# Altium footprint library mastermind.PCBLIB: 1061 footprints (part 53 of 67)
Each footprint in its own frame and in the unit in brackets; x right, y up, seen from the top. Pads: shape width x height; smd on the part's side, far side on the other; paste and mask are expansions set on the pad; w line width, h text height; cw(c..) or ccw(c..) is an arc to the next point about the centre after c.
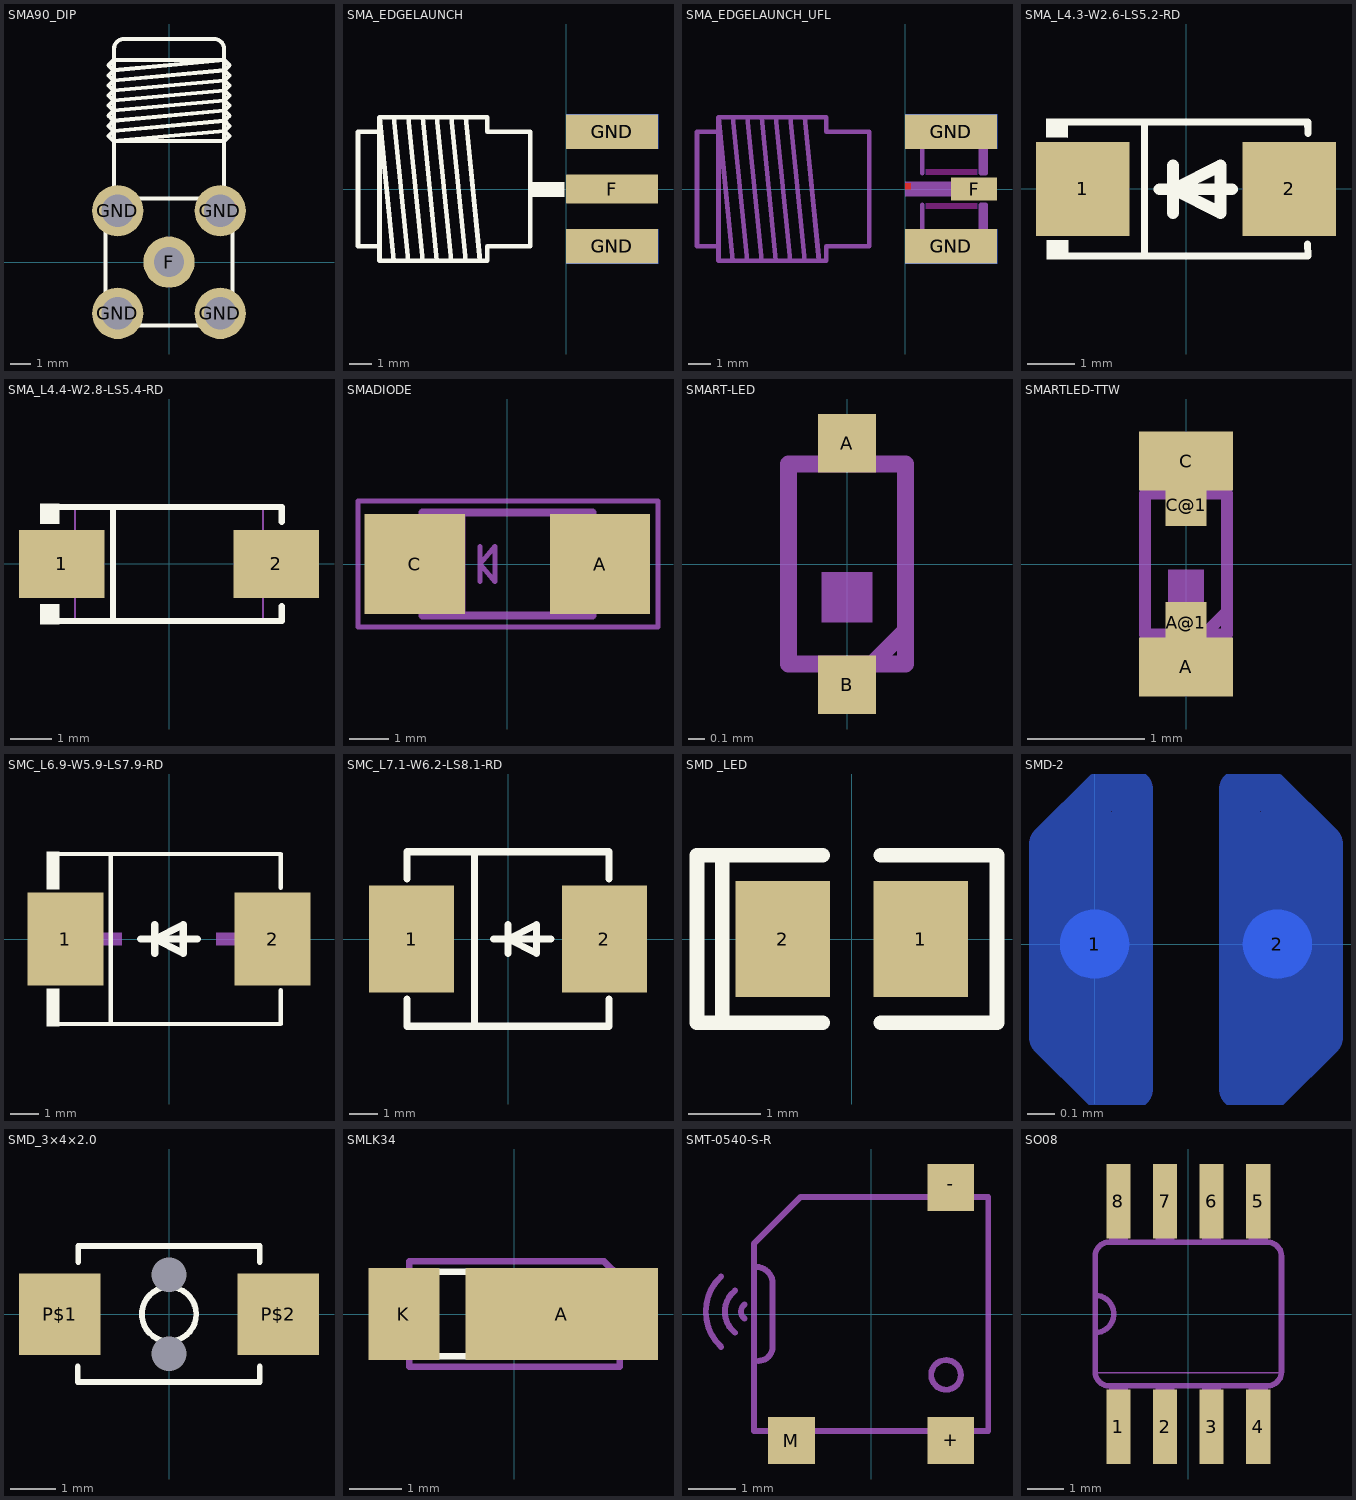
[diagram p52: the footprints below, top view; thin cyan lines are the x and y axes]

## SMA90_DIP [mm]
pads (5):
  round 2.54 hole 1.5: F(0,0)
  round 2.54 hole 1.6: GND(-2.54,-2.54) GND(-2.54,2.54) GND(2.54,-2.54) GND(2.54,2.54)
Top Overlay:
  lines w0.203: -2.725,3.15 -2.725,10.55 ; -2.72,10.565 cw(c-2.235,10.565) -2.235,11.05 ; -2.225,11.05 2.225,11.05 ; 2.24,11.05 cw(c2.24,10.565) 2.725,10.565 ; 2.725,3.15 2.725,10.55 ; -2.75,6 2.75,6.5 ; -2.75,6 2.75,6 3,6.25 2.75,6.5 ; -2.75,6 -3,6.25 -2.75,6.5 ; -2.75,6.5 2.75,7 ; -2.75,6.5 -3,6.75 -2.75,7 ; -2.75,7 2.75,7.5 ; -2.75,7 -3,7.25 -2.75,7.5 ; -2.75,7.5 2.75,8 ; -2.75,7.5 -3,7.75 -2.75,8 ; -2.75,8 2.75,8.5 ; -2.75,8 -3,8.25 -2.75,8.5 ; -2.75,8.5 2.75,9 ; -2.75,8.5 -3,8.75 -2.75,9 ; -2.75,9 2.75,9.5 ; -2.75,9 -3,9.25 -2.75,9.5 ; -2.75,9.5 2.75,10 ; -2.75,9.5 -3,9.75 -2.75,10 2.75,10 ; 2.75,6.5 3,6.75 2.75,7 ; 2.75,7 3,7.25 2.75,7.5 ; 2.75,7.5 3,7.75 2.75,8 ; 2.75,8 3,8.25 2.75,8.5 ; 2.75,8.5 3,8.75 2.75,9 ; 2.75,9 3,9.25 2.75,9.5 ; 2.75,9.5 3,9.75 2.75,10 ; -3.15,-2.52 ccw(c-2.52,-2.52) -2.52,-3.15 2.52,-3.15 ccw(c2.52,-2.52) 3.15,-2.52 3.15,2.52 ccw(c2.52,2.52) 2.52,3.15 -2.52,3.15 ccw(c-2.52,2.52) -3.15,2.52 -3.15,-2.52

## SMA_EDGELAUNCH [mil]
pads (5):
  rect 160x50 smd paste-80: F(80,0)
  rect 160x60 smd paste-80: GND(80,-100) GND(80,100)
  rect 160x60 smd far side paste-80: GND(80,-100) GND(80,100)
Top Overlay:
  region: -60,-13.5 -60,11.5 -3.5,11.5 -3.5,-13.5
  lines w8: -150,-125 -175,125 ; -325,-100 -325,100 ; -325,-100 -325,-125 -300,-125 ; -325,-100 -362.5,-100 -362.5,100 -325,100 ; -325,100 -325,125 ; -325,125 -300,-125 ; -325,125 -300,125 ; -300,-125 -275,-125 ; -300,125 -275,-125 ; -300,125 -275,125 ; -275,-125 -250,-125 ; -275,125 -250,-125 ; -275,125 -250,125 ; -250,-125 -225,-125 ; -250,125 -225,-125 ; -250,125 -225,125 ; -225,-125 -200,-125 ; -225,125 -200,-125 ; -225,125 -200,125 ; -200,-125 -175,-125 ; -200,125 -175,-125 ; -200,125 -175,125 ; -175,-125 -137.5,-125 -137.5,-100 -62.5,-100 -62.5,100 -137.5,100 -137.5,125 -175,125

## SMA_EDGELAUNCH_UFL [mil]
pads (5):
  rect 80x40 smd paste-40: F(120,0)
  rect 160x60 smd paste-80: GND(80,-100) GND(80,100)
  rect 160x60 smd far side paste-80: GND(80,-100) GND(80,100)
Top Layer:
  region: 0,0 10,0 10,10 0,10
  region: 0,0 10,0 10,10 0,10
Top Layer keep-out:
  region: 36,25 36,34 126,34 126,25
  region: 36,-34 36,-25 126,-25 126,-34
Top Paste:
  region: 123,-38.94 123,-70.94 39,-70.94 39,-38.94
  region: 39,38.94 39,70.94 123,70.94 123,38.94
  region: 126,-19 126,19 156,19 156,-19
Top Solder:
  region: 127,-36.94 127,-72.94 35,-72.94 35,-36.94
  region: 35,36.94 35,72.94 127,72.94 127,36.94
Mechanical 8:
  region: 0,0 10,0 10,10 0,10
  region: 0,0 10,0 10,10 0,10
  region: 0,-12.5 0,12.5 125,12.5 125,-12.5
  lines w8: -150,-125 -175,125 ; 29.82,-27.56 29.82,-82.68 132.18,-82.68 ; 29.82,27.56 29.82,82.68 132.18,82.68 ; 136.12,-78.74 136.12,-27.56 ; 136.12,27.56 136.12,78.74 ; -325,-100 -325,100 ; -325,-100 -362.5,-100 -362.5,100 -325,100 ; -325,-100 -325,-125 -300,-125 ; -325,100 -325,125 ; -325,125 -300,-125 ; -325,125 -300,125 ; -300,-125 -275,-125 ; -300,125 -275,-125 ; -300,125 -275,125 ; -275,-125 -250,-125 ; -275,125 -250,-125 ; -275,125 -250,125 ; -250,-125 -225,-125 ; -250,125 -225,-125 ; -250,125 -225,125 ; -225,-125 -200,-125 ; -225,125 -200,-125 ; -225,125 -200,125 ; -200,-125 -175,-125 ; -200,125 -175,-125 ; -200,125 -175,125 ; -175,-125 -137.5,-125 -137.5,-100 -62.5,-100 -62.5,100 -137.5,100 -137.5,125 -175,125 ; 132.18,-82.68 140.06,-82.68 140.06,-27.56 132.18,-27.56 132.18,-82.68 ; 132.18,82.68 140.06,82.68 140.06,27.56 132.18,27.56 132.18,82.68

## SMA_L4.3-W2.6-LS5.2-RD [mm]
pads (2):
  rect 2x2 smd paste+0 mask+0.051: 1(-2.2,0) 2(2.2,0)
Top Overlay:
  region: -2.52,1.502 -2.521,1.096 -2.981,1.1 -2.977,1.502
  region: -2.512,-1.096 -2.513,-1.503 -2.973,-1.498 -2.969,-1.096
  lines w0.152: -2.596,-1.426 2.596,-1.426 ; -2.596,1.426 2.596,1.426 2.603,1.187 ; -0.884,-1.426 -0.884,1.426 ; 2.593,-1.176 2.6,-1.415
  lines w0.254: -0.565,-0.005 0.984,-0.005 ; -0.276,0.503 -0.276,-0.513 -0.276,-0.005 ; -0.276,-0.005 0.74,-0.513 0.74,0.503 -0.276,-0.005
Mechanical 15:
  region: -2.317,-0.101 -2.317,0.101 -1.507,0.101 -1.507,-0.101
  region: 2.29,-0.09 2.29,0.112 1.48,0.112 1.48,-0.09
  region: 2.014,-0.675 2.014,0.675 1.811,0.675 1.811,-0.675

## SMA_L4.4-W2.8-LS5.4-RD [mm]
pads (2):
  rect 2.046x1.62 smd paste+0 mask+0.051: 1(-2.565,0) 2(2.565,0)
Top Overlay:
  region: -2.625,-1.44 -2.625,-0.962 -3.082,-0.962 -3.082,-1.44
  region: -2.625,1.44 -2.625,0.962 -3.082,0.962 -3.082,1.44
  lines w0.152: -2.701,-1.364 2.701,-1.364 2.701,-1.013 ; -2.701,1.364 2.701,1.364 2.701,1.013 ; -1.339,-1.364 -1.339,1.364
Mechanical 6:
  region: 2.142,-0.644 2.142,0.644 1.949,0.644 1.949,-0.644
  region: 2.432,-0.097 2.432,0.097 1.659,0.097 1.659,-0.097
  region: -2.432,-0.097 -2.432,0.097 -1.659,0.097 -1.659,-0.097
Mechanical 15:
  region: 2.809,0.725 2.809,-0.725 1.659,-0.725 1.659,0.725
  region: -2.8,-0.725 -2.8,0.725 -1.65,0.725 -1.65,-0.725
  region: -2.74,-1.375 -2.74,-1.35 -2.775,-1.315 -2.825,-1.315 -2.86,-1.35 -2.86,-1.375 -2.86,-1.4 -2.825,-1.435 -2.775,-1.435 -2.74,-1.4
  lines w0.051: -2.25,-1.375 2.25,-1.375 2.25,1.375 -2.25,1.375 -2.25,-1.375

## SMADIODE [mil]
pads (2):
  rect 100x100 smd: A(92.5,0) C(-92.5,0)
Mechanical 2:
  lines w5: -149.17,-54.88 -149.17,-45.12 ; -27.5,-17.5 -27.5,17.5 ; 150.24,52.62 150.24,54.88 ; -149.17,-45.12 -149.17,-62.99 150.24,-62.99 150.24,54.88 ; -149.17,-45.12 -149.17,62.99 150.24,62.99 150.24,54.88 ; -27.5,0 -12.5,-17.5 -12.5,17.5 -27.5,0
Mechanical 8:
  region: -68.9,-48.23 -68.9,48.23 -42.32,48.23 -42.32,-48.23
  region: 111.22,43.31 111.22,-43.31 85.63,-43.31 85.63,43.31
  region: -111.22,-43.31 -111.22,43.31 -85.63,43.31 -85.63,-43.31
  lines w8: -84.65,-51.18 -84.65,51.18 84.65,51.18 84.65,-51.18 -84.65,-51.18

## SMART-LED [mm]
pads (2):
  rect 0.35x0.35 smd: A(0,0.725) B(0,-0.725)
Mechanical 2:
  region: -0.15,-0.35 -0.15,-0.05 0.15,-0.05 0.15,-0.35
  lines w0.102: -0.35,-0.6 -0.35,0.6 ; 0.35,-0.6 0.35,0.6
Mechanical 8:
  region: -0.15,0.6 -0.15,0.85 0.15,0.85 0.15,0.6
  region: -0.15,-0.85 -0.15,-0.6 0.15,-0.6 0.15,-0.85
  lines w0.102: -0.35,-0.6 0.35,-0.6 ; -0.35,0.6 0.35,0.6 ; 0.15,-0.6 0.35,-0.4

## SMARTLED-TTW [mm]
pads (4):
  rect 0.8x0.5 smd paste-0.4 mask-0.4: A(0,-0.875) C(0,0.875)
  rect 0.35x0.35 smd paste-0.175 mask-0.175: A@1(0,-0.5) C@1(0,0.5)
Top Paste:
  region: 0.225,-0.3 0.225,-0.975 -0.225,-0.975 -0.225,-0.3
  region: -0.225,0.3 -0.225,0.975 0.225,0.975 0.225,0.3
Top Solder:
  region: 0.175,-0.325 0.175,-0.7 -0.175,-0.7 -0.175,-0.325
  region: -0.175,0.325 -0.175,0.7 0.175,0.7 0.175,0.325
Mechanical 2:
  region: -0.15,-0.35 -0.15,-0.05 0.15,-0.05 0.15,-0.35
  lines w0.102: -0.35,-0.6 -0.35,0.6 ; 0.35,-0.6 0.35,0.6
Mechanical 8:
  region: -0.15,-0.85 -0.15,-0.6 0.15,-0.6 0.15,-0.85
  region: -0.15,0.6 -0.15,0.85 0.15,0.85 0.15,0.6
  lines w0.102: -0.35,-0.6 0.35,-0.6 ; -0.35,0.6 0.35,0.6 ; 0.15,-0.6 0.35,-0.4

## SMC_L6.9-W5.9-LS7.9-RD [mm]
pads (2):
  rect 2.7x3.3 smd paste+0 mask+0.051: 1(-3.686,0) 2(3.686,0)
Top Overlay:
  region: -3.9,3.102 -3.9,1.772 -4.357,1.772 -4.357,3.102
  region: -3.9,-3.102 -3.9,-1.772 -4.357,-1.772 -4.357,-3.102
  lines w0.152: -3.976,-3.026 3.976,-3.026 3.976,-1.823 ; -3.976,3.026 3.976,3.026 3.976,1.823 ; -2.069,-3.026 -2.069,3.026
  lines w0.254: -1.016,0 1.016,0 ; -0.508,0.508 -0.508,-0.508 -0.508,0 ; -0.508,0 0.508,-0.508 0.508,0.508 -0.508,0
Mechanical 15:
  region: -3.457,-0.221 -3.457,0.221 -1.687,0.221 -1.687,-0.221
  region: 3.457,-0.221 3.457,0.221 1.687,0.221 1.687,-0.221
  region: 2.794,-1.475 2.794,1.475 2.351,1.475 2.351,-1.475

## SMC_L7.1-W6.2-LS8.1-RD [mm]
pads (2):
  rect 3.03x3.82 smd paste+0 mask+0.051: 1(-3.435,0) 2(3.435,0)
Top Overlay:
  lines w0.254: -3.6,-2.141 -3.6,-3.11 3.6,-3.11 3.6,-2.141 ; -3.6,2.141 -3.6,3.11 3.6,3.11 3.6,2.141 ; -1.192,-3.11 -1.192,3.11 ; -0.508,0 1.524,0 ; 0,0.508 0,-0.508 0,0 ; 0,0 1.016,0.508 1.016,-0.508 0,0
Mechanical 15:
  region: 2.54,0.254 4.318,0.254 4.318,-0.254 2.54,-0.254
  region: 3.181,-0.895 3.181,0.883 3.689,0.883 3.689,-0.895
  region: -4.33,0.254 -2.552,0.254 -2.552,-0.254 -4.33,-0.254
3D body "DO-214AB.STEP": height 2.79, standoff -0.14, extent -4.05,-3.125 4,3.125

## SMD _LED [mm]
pads (2):
  rect 1.3x1.6 smd: 1(0.948,0.006) 2(-0.952,0.006)
Top Overlay:
  lines w0.2: -1.782,-1.144 -1.782,1.156 ; -0.402,-1.144 -2.132,-1.144 -2.132,1.156 -0.402,1.156 ; 0.398,-1.144 1.998,-1.144 1.998,1.156 0.398,1.156
3D body: height 0.64, standoff 0, extent -1.524,-0.635 1.524,0.635
3D body: height 1.27, standoff 0, extent -0.508,-0.508 0.508,0.508

## SMD-2 [mil]
pads (2):
  round 10 smd far side: 1(0,0) 2(26.5,0)
Bottom Layer:
  lines w6: 5.5,-12.5 5.5,-16.5 1,-21 ; 21,-12.5 21,-16.5 25.5,-21 ; 1,-21 -6.5,-13.5 -6.5,14.5 1.5,22.5 5.5,22.5 5.5,-6 5.5,-21 1,-21 ; 25.5,-21 33,-13.5 33,14.5 25,22.5 21,22.5 21,-6 21,-21 25.5,-21 ; -5,-11 0,-16 0,17.5 -5,12.5 -5,-11 ; 26.5,-16 26.5,17.5 31.5,12.5 31.5,-11 26.5,-16
Bottom Solder:
  lines w6: 5.5,-12.5 5.5,-16.5 1,-21 ; 21,-12.5 21,-16.5 25.5,-21 ; 1,-21 -6.5,-13.5 -6.5,14.5 1.5,22.5 5.5,22.5 5.5,-6 5.5,-21 1,-21 ; 25.5,-21 33,-13.5 33,14.5 25,22.5 21,22.5 21,-6 21,-21 25.5,-21 ; -5,-11 0,-16 0,17.5 -5,12.5 -5,-11 ; 26.5,-16 26.5,17.5 31.5,12.5 31.5,-11 26.5,-16

## SMD_3×4×2.0 [mm]
pads (4):
  rect 1.8x1.8 smd: P$1(-2.413,0) P$2(2.413,0)
  round 0 hole 0.762: ""(0,-0.875) ""(0,0.875)
Top Overlay:
  circle w0.127: c0,0 r0.6
  lines w0.127: -2.018,-1.497 -2.018,-1.154 ; -2.005,1.154 -2.005,1.503 ; -2,-1.497 2,-1.497 ; -2,1.505 2,1.505 ; 2.004,-1.497 2.004,-1.154 ; 2.004,1.154 2.004,1.503
3D body "User Library-Pushbutton3x4x2.step": height 2, standoff 0, extent -2.487,-1.45 2.413,1.45

## SMLK34 [mil]
pads (2):
  rect 143.7x68.5 smd: A(35.43,0)
  rect 53.15x68.5 smd: K(-82.68,0)
Top Overlay:
  lines w5: -70.87,-31.5 70.87,-31.5 70.87,23.62 62.99,31.5 -70.87,31.5 -70.87,-31.5
Mechanical 2:
  lines w5: -78.74,-39.37 -78.74,39.37 66.93,39.37 78.74,27.56 78.74,-39.37 -78.74,-39.37

## SMT-0540-S-R [mm]
pads (3):
  rect 1x1 smd: +(1.7,-2.7) -(1.7,2.7) M(-1.7,-2.7)
Mechanical 2:
  circle w0.127: c1.6,-1.3 r0.316
  lines w0.127: -3.2,-0.7 cw(c-2.5,0.05) -3.2,0.8 ; -2.9,-0.4 cw(c-2.55,0.05) -2.9,0.5 ; -2.7,-0.1 cw(c-2.588,0.05) -2.7,0.2 ; -2.4,-1 ccw(c-2.4,-0.7) -2.1,-0.7 -2.1,0.7 ccw(c-2.45,0.65) -2.5,1 ; -2.5,1 -2.5,1.5 -1.5,2.5 2.5,2.5 2.5,-2.5 -2.5,-2.5 -2.5,1

## SO08 [mil]
pads (8):
  rect 26x80 smd: 1(-75,-121) 2(-25,-121) 3(25,-121) 4(75,-121) 5(75,121) 6(25,121) 7(-25,121) 8(-75,121)
Mechanical 2:
  lines w2: -100,-63 100,-63
  lines w6: -100,-20 ccw(c-100,0) -100,20 ; -100,-62 ccw(c-85,-62) -85,-77 85,-77 ccw(c85,-62) 100,-62 100,62 ccw(c85,62) 85,77 -85,77 ccw(c-85,62) -100,62 -100,-62
Mechanical 8:
  region: -85,77 -85,122 -65,122 -65,77
  region: -35,77 -35,122 -15,122 -15,77
  region: 15,77 15,122 35,122 35,77
  region: 65,-122 65,-77 85,-77 85,-122
  region: 15,-121 15,-76 35,-76 35,-121
  region: -35,-122 -35,-77 -15,-77 -15,-122
  region: -85,-122 -85,-77 -65,-77 -65,-122
  region: 65,77 65,122 85,122 85,77